# Altium footprint library 22-Transformer.PcbLib: 68 footprints (part 3 of 5) (continued)
## XFMR_EDA-01905-V1-0_MISC4 [mm] "E55/28/21 Core + Coil Former + Spring + Clasp"
height 65.3
pads (4):
  round 5.6 hole 2.7: MTG(-25.4,-13.97) MTG(-25.4,13.97) MTG(25.4,-13.97) MTG(25.4,13.97)
Top Overlay:
  lines w0.2: -29.4,-4.509 -30.1,-4.254 -30.1,4.254 -29.4,4.509 ; -27.842,-11.75 -29.4,-11.75 ; -27.842,11.75 -29.4,11.75 ; -26.122,-10.75 -28.4,-10.75 -28.4,10.75 -26.122,10.75 ; -22.647,-12.15 22.647,-12.15 ; -22.647,12.15 22.647,12.15 ; -21.354,-12.15 ccw(c-18.4,-13.97) -21.87,-13.97 cw(c-25.4,-13.97) -28.93,-13.97 -28.93,-11.75 -29.4,-11.75 ; -21.354,12.15 cw(c-18.4,13.97) -21.87,13.97 ccw(c-25.4,13.97) -28.93,13.97 -28.93,11.75 -29.4,11.75 ; -18.3,-12.15 -18.3,-18.075 ccw(c-15.3,-18.075) -15.3,-21.075 15.3,-21.075 ccw(c15.3,-18.075) 18.3,-18.075 18.3,-12.15 ; -18.3,12.15 -18.3,18.075 cw(c-15.3,18.075) -15.3,21.075 15.3,21.075 cw(c15.3,18.075) 18.3,18.075 18.3,12.15 ; 21.354,-12.15 cw(c18.4,-13.97) 21.87,-13.97 ccw(c25.4,-13.97) 28.93,-13.97 28.93,-11.75 29.4,-11.75 ; 21.354,12.15 ccw(c18.4,13.97) 21.87,13.97 cw(c25.4,13.97) 28.93,13.97 28.93,11.75 29.4,11.75 ; 26.122,-10.75 28.4,-10.75 28.4,10.75 26.122,10.75 ; 27.842,-11.75 29.4,-11.75 ; 27.842,11.75 29.4,11.75 ; 29.4,-4.509 30.1,-4.254 30.1,4.254 29.4,4.509 ; -29.4,-11.75 -29.4,11.75 ; -29.4,-11.75 -29.4,11.75 ; 29.4,-11.75 29.4,11.75 ; 29.4,-11.75 29.4,11.75 ; -20.874,-2.837 cw(c-19.898,0) -20.874,2.837 -5,8.3 -5,-8.3 -20.874,-2.837 ; 5,-8.3 5,8.3 20.875,2.837 cw(c19.898,0) 20.875,-2.837 5,-8.3
Mechanical 8:
  lines w0.1: -25.9,13.97 -25.4,13.97 ; -25.4,13.47 -25.4,13.97 ; -25.4,14.47 -25.4,13.97 ; -24.9,13.97 -25.4,13.97 ; 24.9,13.97 25.4,13.97 ; 25.4,13.47 25.4,13.97 ; 25.4,14.47 25.4,13.97 ; 25.9,13.97 25.4,13.97 ; -25.4,-13.97 -25.9,-13.97 -25.4,-13.97 ; -25.4,-13.97 -25.4,-13.47 -25.4,-13.97 ; -25.4,-13.97 -24.9,-13.97 -25.4,-13.97 ; -25.4,-13.97 -25.4,-14.47 -25.4,-13.97 ; 0,0 -0.5,0 0,0 ; 0,0 0,0.5 0,0 ; 0,0 0.5,0 0,0 ; 0,0 0,-0.5 0,0 ; 25.4,-13.97 24.9,-13.97 25.4,-13.97 ; 25.4,-13.97 25.4,-13.47 25.4,-13.97 ; 25.4,-13.97 25.9,-13.97 25.4,-13.97 ; 25.4,-13.97 25.4,-14.47 25.4,-13.97
Mechanical 14:
  circle w0.1: c-25.4,13.97 r1.4
  circle w0.1: c25.4,13.97 r1.4
  circle w0.1: c-25.4,-13.97 r1.4
  circle w0.1: c25.4,-13.97 r1.4
  lines w0.1: -29.4,-4.509 -30.1,-4.254 -30.1,4.254 -29.4,4.509 ; -25.4,-11.15 -23,-11.15 -23,-12.15 23,-12.15 23,-11.15 25.403,-11.15 ; -25.4,11.15 -23,11.15 -23,12.15 23,12.15 23,11.15 25.4,11.15 ; -21.354,-12.15 ccw(c-18.4,-13.97) -21.87,-13.97 cw(c-25.4,-13.97) -28.93,-13.97 -28.93,-11.75 -29.4,-11.75 ; -21.354,12.15 cw(c-18.4,13.97) -21.87,13.97 ccw(c-25.4,13.97) -28.93,13.97 -28.93,11.75 -29.4,11.75 ; -18.3,-12.15 -18.3,-18.075 ccw(c-15.3,-18.075) -15.3,-21.075 15.3,-21.075 ccw(c15.3,-18.075) 18.3,-18.075 18.3,-12.15 ; -18.3,12.15 -18.3,18.075 cw(c-15.3,18.075) -15.3,21.075 15.3,21.075 cw(c15.3,18.075) 18.3,18.075 18.3,12.15 ; 21.354,-12.15 cw(c18.4,-13.97) 21.87,-13.97 ccw(c25.4,-13.97) 28.93,-13.97 28.93,-11.75 29.4,-11.75 ; 21.354,12.15 ccw(c18.4,13.97) 21.87,13.97 cw(c25.4,13.97) 28.93,13.97 28.93,11.75 29.4,11.75 ; 29.4,-4.509 30.1,-4.254 30.1,4.254 29.4,4.509 ; -29.4,-11.75 -29.4,11.75 ; -29.4,-11.75 -25.4,-11.75 -25.4,-10.75 -28.4,-10.75 -28.4,10.75 -25.4,10.75 -25.4,11.75 -29.4,11.75 ; -29.4,-11.75 -29.4,11.75 ; 29.4,-11.75 25.403,-11.75 25.403,-10.75 28.4,-10.75 28.4,10.75 25.4,10.75 25.4,11.75 29.4,11.75 ; 29.4,-11.75 29.4,11.75 ; 29.4,-11.75 29.4,11.75 ; -20.874,-2.837 cw(c-19.898,0) -20.874,2.837 -5,8.3 -5,-8.3 -20.874,-2.837 ; 5,-8.3 5,8.3 20.875,2.837 cw(c19.898,0) 20.875,-2.837 5,-8.3
3D body "XFMR_EDA-01905-V1-0_misc4.stp": height 65.3, standoff -4, extent -30.1,-21.275 30.1,21.275

## XFMR_EDA-01905-V1-0_MISC5 [mm] "ETD39 Core + Coil Former + Yoke"
height 33.5
pads (16):
  round 2.1 hole 1.4: 1(-17.78,-15.24) 2(-12.7,-15.24) 3(-7.62,-15.24) 4(-2.54,-15.24) 5(2.54,-15.24) 6(7.62,-15.24) 7(12.7,-15.24) 8(17.78,-15.24) 9(17.78,15.24) 10(12.7,15.24) 11(7.62,15.24) 12(2.54,15.24) 13(-2.54,15.24) 14(-7.62,15.24) 15(-12.7,15.24) 16(-17.78,15.24)
Top Overlay:
  lines w0.2: -20,-13.59 -20,13.59 ; -13.178,-13.59 -13.178,13.59 ; -13.178,-12.85 13.178,-12.85 ; -13.178,12.85 13.178,12.85 ; -8.63,-14.2 -11.27,-14.2 -11.27,-13.59 -21.7,-13.59 -21.7,-12.94 -22.5,-12.94 -22.5,-20.846 ccw(c-21.2,-20.846) -22.3,-21.539 -22.3,-23.4 22.3,-23.4 22.3,-21.676 ccw(c21.3,-20.846) 22.599,-20.806 ; -8.63,14.2 -11.27,14.2 -11.27,13.59 -21.7,13.59 -21.7,12.94 -22.5,12.94 -22.5,20.846 cw(c-21.2,20.846) -22.3,21.539 -22.3,23.4 22.3,23.4 22.3,21.676 cw(c21.3,20.846) 22.599,20.806 ; -6.61,-14.2 -3.55,-14.2 ; -6.61,14.2 -3.55,14.2 ; -6.15,-14.2 -6.15,-23.64 -5.15,-23.64 -5.15,-14.2 ; -6.15,14.2 -6.15,17.7 -5.15,17.7 -5.15,14.2 ; -3.95,-14.2 -3.95,-12.85 ; -3.95,12.85 -3.95,14.2 ; -1.53,-14.2 1.53,-14.2 ; -1.53,14.2 1.53,14.2 ; 3.55,-14.2 6.61,-14.2 ; 3.55,14.2 6.61,14.2 ; 3.95,-14.2 3.95,-12.85 ; 3.95,12.85 3.95,14.2 ; 5.15,-14.2 5.15,-17.09 6.15,-17.09 6.15,-14.2 ; 5.15,14.2 5.15,17.7 6.15,17.7 6.15,14.2 ; 8.63,-14.2 11.27,-14.2 11.27,-13.59 21.8,-13.59 21.8,-12.94 22.6,-12.94 22.6,-20.846 ; 8.63,14.2 11.27,14.2 11.27,13.59 21.8,13.59 21.8,12.94 22.6,12.94 22.6,20.846 ; 13.178,-13.59 13.178,13.59 ; 20,-13.59 20,13.59 ; -12.425,-12.85 -12.425,12.85 12.425,12.85 12.425,-12.85 -12.425,-12.85
  text "1" at -17.899,-19.74 h1.2
  text "2" at -13.033,-19.74 h1.2
  text "3" at -7.953,-19.74 h1.2
  text "4" at -2.897,-19.74 h1.2
  text "5" at 2.207,-19.74 h1.2
  text "6" at 7.31,-19.74 h1.2
  text "7" at 12.367,-19.74 h1.2
  text "8" at 17.447,-19.74 h1.2
  text "9" at 17.447,18.74 h1.2
  text "14" at -8.358,18.74 h1.2
  text "13" at -3.254,18.74 h1.2
  text "12" at 1.826,18.74 h1.2
  text "10" at 11.986,18.74 h1.2
  text "11" at 6.906,18.74 h1.2
  text "15" at -13.414,18.74 h1.2
  text "16" at -18.494,18.74 h1.2
Mechanical 8:
  lines w0.1: -18.78,-15.24 -17.78,-15.24 ; -18.78,15.24 -17.78,15.24 ; -17.78,-16.24 -17.78,-15.24 ; -17.78,-14.24 -17.78,-15.24 ; -17.78,14.24 -17.78,15.24 ; -17.78,16.24 -17.78,15.24 ; -16.78,-15.24 -17.78,-15.24 ; -16.78,15.24 -17.78,15.24 ; -13.7,-15.24 -12.7,-15.24 ; -13.7,15.24 -12.7,15.24 ; -12.7,-16.24 -12.7,-15.24 ; -12.7,-14.24 -12.7,-15.24 ; -12.7,14.24 -12.7,15.24 ; -12.7,16.24 -12.7,15.24 ; -11.7,-15.24 -12.7,-15.24 ; -11.7,15.24 -12.7,15.24 ; -8.62,-15.24 -7.62,-15.24 ; -8.62,15.24 -7.62,15.24 ; -7.62,-16.24 -7.62,-15.24 ; -7.62,-14.24 -7.62,-15.24 ; -7.62,14.24 -7.62,15.24 ; -7.62,16.24 -7.62,15.24 ; -6.62,-15.24 -7.62,-15.24 ; -6.62,15.24 -7.62,15.24 ; -3.54,-15.24 -2.54,-15.24 ; -3.54,15.24 -2.54,15.24 ; -2.54,-16.24 -2.54,-15.24 ; -2.54,-14.24 -2.54,-15.24 ; -2.54,14.24 -2.54,15.24 ; -2.54,16.24 -2.54,15.24 ; -1.54,-15.24 -2.54,-15.24 ; -1.54,15.24 -2.54,15.24 ; -1,0 0,0 ; 0,-1 0,0 ; 0,1 0,0 ; 1,0 0,0 ; 1.54,-15.24 2.54,-15.24 ; 1.54,15.24 2.54,15.24 ; 2.54,-16.24 2.54,-15.24 ; 2.54,-14.24 2.54,-15.24 ; 2.54,14.24 2.54,15.24 ; 2.54,16.24 2.54,15.24 ; 3.54,-15.24 2.54,-15.24 ; 3.54,15.24 2.54,15.24 ; 6.62,-15.24 7.62,-15.24 ; 6.62,15.24 7.62,15.24 ; 7.62,-16.24 7.62,-15.24 ; 7.62,-14.24 7.62,-15.24 ; 7.62,14.24 7.62,15.24 ; 7.62,16.24 7.62,15.24 ; 8.62,-15.24 7.62,-15.24 ; 8.62,15.24 7.62,15.24 ; 11.7,-15.24 12.7,-15.24 ; 11.7,15.24 12.7,15.24 ; 12.7,-16.24 12.7,-15.24 ; 12.7,-14.24 12.7,-15.24 ; 12.7,14.24 12.7,15.24 ; 12.7,16.24 12.7,15.24 ; 13.7,-15.24 12.7,-15.24 ; 13.7,15.24 12.7,15.24 ; 16.78,-15.24 17.78,-15.24 ; 16.78,15.24 17.78,15.24 ; 17.78,-16.24 17.78,-15.24 ; 17.78,-14.24 17.78,-15.24 ; 17.78,14.24 17.78,15.24 ; 17.78,16.24 17.78,15.24 ; 18.78,-15.24 17.78,-15.24 ; 18.78,15.24 17.78,15.24
Mechanical 14:
  lines w0.1: -20,-13.59 -20,13.59 ; -13.178,-13.59 -13.178,13.59 ; -13.178,-12.85 13.178,-12.85 ; -13.178,12.85 13.178,12.85 ; -6.15,-14.2 -6.15,-23.64 -5.15,-23.64 -5.15,-14.2 ; -6.15,14.2 -6.15,17.7 -5.15,17.7 -5.15,14.2 ; -3.95,-14.2 -3.95,-12.85 ; -3.95,12.85 -3.95,14.2 ; 3.95,-14.2 3.95,-12.85 ; 3.95,12.85 3.95,14.2 ; 5.15,-14.2 5.15,-17.09 6.15,-17.09 6.15,-14.2 ; 5.15,14.2 5.15,17.7 6.15,17.7 6.15,14.2 ; 13.178,-13.59 13.178,13.59 ; 20,-13.59 20,13.59 ; 22.6,-20.846 22.6,-12.94 21.8,-12.94 21.8,-13.59 11.27,-13.59 11.27,-14.2 -11.27,-14.2 -11.27,-13.59 -21.7,-13.59 -21.7,-12.94 -22.5,-12.94 -22.5,-20.846 ccw(c-21.2,-20.846) -22.3,-21.539 -22.3,-23.4 22.3,-23.4 22.3,-21.676 ccw(c21.3,-20.846) 22.599,-20.806 ; 22.599,20.806 ccw(c21.3,20.846) 22.3,21.676 22.3,23.4 -22.3,23.4 -22.3,21.539 ccw(c-21.2,20.846) -22.5,20.846 -22.5,12.94 -21.7,12.94 -21.7,13.59 -11.27,13.59 -11.27,14.2 11.27,14.2 11.27,13.59 21.8,13.59 21.8,12.94 22.6,12.94 22.6,20.846 ; -12.425,-12.85 -12.425,12.85 12.425,12.85 12.425,-12.85 -12.425,-12.85
  text "1" at -17.899,-19.74 h1.2
  text "2" at -13.033,-19.74 h1.2
  text "3" at -7.953,-19.74 h1.2
  text "4" at -2.897,-19.74 h1.2
  text "5" at 2.207,-19.74 h1.2
  text "6" at 7.31,-19.74 h1.2
  text "7" at 12.367,-19.74 h1.2
  text "8" at 17.447,-19.74 h1.2
  text "9" at 17.447,18.74 h1.2
  text "14" at -8.358,18.74 h1.2
  text "13" at -3.254,18.74 h1.2
  text "12" at 1.826,18.74 h1.2
  text "10" at 11.986,18.74 h1.2
  text "11" at 6.906,18.74 h1.2
  text "15" at -13.414,18.74 h1.2
  text "16" at -18.494,18.74 h1.2
3D body "XFMR_EDA-01905-V1-0_misc5.stp": height 35.5, standoff -4.5, extent -22.5,-23.64 22.6,23.4

## XFMR_EDA-02116-V1-0_MISC1 [mm] "Transformer D40 x L 65.5"
height 40
Top Overlay:
  lines w0.2: -32.3,-11.45 -57.3,-11.45 -57.3,-7.75 -32.3,-7.75 ; -32.3,3.75 -42,3.75 -42,4.65 -32.3,4.65 ; -32.3,10.35 -42,10.35 -42,11.25 -32.3,11.25 ; -32.3,-20.25 -32.3,20.25 33.3,20.25 33.3,-20.25 -32.3,-20.25
  text "CATHODE" at -42,5.4 h1.5
  text "GATE" at -39.75,12 h1.5
Top Solder:
  lines w1.27: -23.5,-13.51 ccw(c-23,-13.51) -23,-14.01 -16,-14.01 ccw(c-16,-13.51) -15.5,-13.51 -15.5,-11.51 ccw(c-16,-11.51) -16,-11.01 -23,-11.01 ccw(c-23,-11.51) -23.5,-11.51 -23.5,-13.51 ; -23.5,11.49 ccw(c-23,11.49) -23,10.99 -16,10.99 ccw(c-16,11.49) -15.5,11.49 -15.5,13.49 ccw(c-16,13.49) -16,13.99 -23,13.99 ccw(c-23,13.49) -23.5,13.49 -23.5,11.49 ; 16.5,-13.51 ccw(c17,-13.51) 17,-14.01 24,-14.01 ccw(c24,-13.51) 24.5,-13.51 24.5,-11.51 ccw(c24,-11.51) 24,-11.01 17,-11.01 ccw(c17,-11.51) 16.5,-11.51 16.5,-13.51 ; 16.5,11.49 ccw(c17,11.49) 17,10.99 24,10.99 ccw(c24,11.49) 24.5,11.49 24.5,13.49 ccw(c24,13.49) 24,13.99 17,13.99 ccw(c17,13.49) 16.5,13.49 16.5,11.49
Bottom Solder:
  lines w1.27: -23.5,-13.51 ccw(c-23,-13.51) -23,-14.01 -16,-14.01 ccw(c-16,-13.51) -15.5,-13.51 -15.5,-11.51 ccw(c-16,-11.51) -16,-11.01 -23,-11.01 ccw(c-23,-11.51) -23.5,-11.51 -23.5,-13.51 ; -23.5,11.49 ccw(c-23,11.49) -23,10.99 -16,10.99 ccw(c-16,11.49) -15.5,11.49 -15.5,13.49 ccw(c-16,13.49) -16,13.99 -23,13.99 ccw(c-23,13.49) -23.5,13.49 -23.5,11.49 ; 16.5,-13.51 ccw(c17,-13.51) 17,-14.01 24,-14.01 ccw(c24,-13.51) 24.5,-13.51 24.5,-11.51 ccw(c24,-11.51) 24,-11.01 17,-11.01 ccw(c17,-11.51) 16.5,-11.51 16.5,-13.51 ; 16.5,11.49 ccw(c17,11.49) 17,10.99 24,10.99 ccw(c24,11.49) 24.5,11.49 24.5,13.49 ccw(c24,13.49) 24,13.99 17,13.99 ccw(c17,13.49) 16.5,13.49 16.5,11.49
Keep-Out Layer:
  board cut-out: -23.424,-11.217 -23.283,-11.076 -23.099,-11 -23,-11 -16,-11 -15.901,-11 -15.717,-11.076 -15.576,-11.217 -15.5,-11.401 -15.5,-11.5 -15.5,-13.5 -15.5,-13.599 -15.576,-13.783 -15.717,-13.924 -15.901,-14 -16,-14 -23,-14 -23.099,-14 -23.283,-13.924 -23.424,-13.783 -23.5,-13.599 -23.5,-11.401
  board cut-out: 16.576,-11.217 16.717,-11.076 16.901,-11 17,-11 24,-11 24.099,-11 24.283,-11.076 24.424,-11.217 24.5,-11.401 24.5,-11.5 24.5,-13.5 24.5,-13.599 24.424,-13.783 24.283,-13.924 24.099,-14 24,-14 17,-14 16.901,-14 16.717,-13.924 16.576,-13.783 16.5,-13.599 16.5,-11.401
  board cut-out: 16.576,13.783 16.717,13.924 16.901,14 17,14 24,14 24.099,14 24.283,13.924 24.424,13.783 24.5,13.599 24.5,13.5 24.5,11.5 24.5,11.401 24.424,11.217 24.283,11.076 24.099,11 24,11 17,11 16.901,11 16.717,11.076 16.576,11.217 16.5,11.401 16.5,13.599
  board cut-out: -23.424,13.783 -23.283,13.924 -23.099,14 -23,14 -16,14 -15.901,14 -15.717,13.924 -15.576,13.783 -15.5,13.599 -15.5,13.5 -15.5,11.5 -15.5,11.401 -15.576,11.217 -15.717,11.076 -15.901,11 -16,11 -23,11 -23.099,11 -23.283,11.076 -23.424,11.217 -23.5,11.401 -23.5,13.599
Mechanical 1:
  lines w1.27: -23.5,-13.5 ccw(c-23,-13.5) -23,-14 -16,-14 ccw(c-16,-13.5) -15.5,-13.5 -15.5,-11.5 ccw(c-16,-11.5) -16,-11 -23,-11 ccw(c-23,-11.5) -23.5,-11.5 -23.5,-13.5 ; -23.5,11.5 ccw(c-23,11.5) -23,11 -16,11 ccw(c-16,11.5) -15.5,11.5 -15.5,13.5 ccw(c-16,13.5) -16,14 -23,14 ccw(c-23,13.5) -23.5,13.5 -23.5,11.5 ; 16.5,-13.5 ccw(c17,-13.5) 17,-14 24,-14 ccw(c24,-13.5) 24.5,-13.5 24.5,-11.5 ccw(c24,-11.5) 24,-11 17,-11 ccw(c17,-11.5) 16.5,-11.5 16.5,-13.5 ; 16.5,11.5 ccw(c17,11.5) 17,11 24,11 ccw(c24,11.5) 24.5,11.5 24.5,13.5 ccw(c24,13.5) 24,14 17,14 ccw(c17,13.5) 16.5,13.5 16.5,11.5
Mechanical 8:
  lines w0.1: -20,-12.5 -19.5,-12.5 ; -20,12.5 -19.5,12.5 ; -19.5,-13 -19.5,-12.5 ; -19.5,-12 -19.5,-12.5 ; -19.5,12 -19.5,12.5 ; -19.5,13 -19.5,12.5 ; -19,-12.5 -19.5,-12.5 ; -19,12.5 -19.5,12.5 ; -0.5,0 0,0 ; 0,-0.5 0,0 ; 0,0.5 0,0 ; 0.5,0 0,0 ; 20,-12.5 20.5,-12.5 ; 20,12.5 20.5,12.5 ; 20.5,-13 20.5,-12.5 ; 20.5,-12 20.5,-12.5 ; 20.5,12 20.5,12.5 ; 20.5,13 20.5,12.5 ; 21,-12.5 20.5,-12.5 ; 21,12.5 20.5,12.5
Mechanical 14:
  lines w0.1: -32.3,-11.45 -57.3,-11.45 -57.3,-7.75 -32.3,-7.75 ; -32.3,3.75 -42,3.75 -42,4.65 -32.3,4.65 ; -32.3,10.35 -42,10.35 -42,11.25 -32.3,11.25 ; -32.3,-20.25 -32.3,20.25 33.3,20.25 33.3,-20.25 -32.3,-20.25 ; -23.5,-13.5 ccw(c-23,-13.5) -23,-14 -16,-14 ccw(c-16,-13.5) -15.5,-13.5 -15.5,-11.5 ccw(c-16,-11.5) -16,-11 -23,-11 ccw(c-23,-11.5) -23.5,-11.5 -23.5,-13.5 ; -23.5,11.5 ccw(c-23,11.5) -23,11 -16,11 ccw(c-16,11.5) -15.5,11.5 -15.5,13.5 ccw(c-16,13.5) -16,14 -23,14 ccw(c-23,13.5) -23.5,13.5 -23.5,11.5 ; 16.5,-13.5 ccw(c17,-13.5) 17,-14 24,-14 ccw(c24,-13.5) 24.5,-13.5 24.5,-11.5 ccw(c24,-11.5) 24,-11 17,-11 ccw(c17,-11.5) 16.5,-11.5 16.5,-13.5 ; 16.5,11.5 ccw(c17,11.5) 17,11 24,11 ccw(c24,11.5) 24.5,11.5 24.5,13.5 ccw(c24,13.5) 24,14 17,14 ccw(c17,13.5) 16.5,13.5 16.5,11.5
  text "CATHODE" at -42,5.4 h1.5
  text "GATE" at -39.75,12 h1.5
Drill Drawing:
  lines w0.1: -28.5,-12.5 -20.5,-12.5 ; -28.5,12.5 -20.5,12.5 ; -27.842,-11.56 -27.5,-12.5 ; -27.842,11.56 -27.5,12.5 ; -27.158,-11.56 -27.5,-12.5 ; -27.158,11.56 -27.5,12.5 ; -20,-12.5 -19.5,-12.5 ; -20,12.5 -19.5,12.5 ; -19.5,-18.5 -19.5,-13.5 ; -19.5,-13 -19.5,-12.5 ; -19.5,-12 -19.5,-12.5 ; -19.5,-11.5 -19.5,11.5 ; -19.5,12 -19.5,12.5 ; -19.5,13 -19.5,12.5 ; -19,-12.5 -19.5,-12.5 ; -19,12.5 -19.5,12.5 ; -18.56,-17.842 -19.5,-17.5 ; -18.56,-17.158 -19.5,-17.5 ; -18.5,-12.5 19.5,-12.5 ; -18.5,12.5 19.5,12.5 ; -0.5,0 0,0 ; 0,-0.5 0,0 ; 0,0.5 0,0 ; 0.5,0 0,0 ; 14.5,11 16.5,11 ; 14.5,14 16.5,14 16.5,16 ; 14.658,10.06 15,11 15.342,10.06 ; 14.658,14.94 15,14 15.342,14.94 ; 15,10.06 15,14.94 ; 15.56,15.158 16.5,15.5 15.56,15.842 ; 15.56,15.5 25.44,15.5 ; 19.56,-17.842 20.5,-17.5 ; 19.56,-17.158 20.5,-17.5 ; 20,-12.5 20.5,-12.5 ; 20,12.5 20.5,12.5 ; 20.5,-18.5 20.5,-13.5 ; 20.5,-13 20.5,-12.5 ; 20.5,-12 20.5,-12.5 ; 20.5,-11.5 20.5,11.5 ; 20.5,12 20.5,12.5 ; 20.5,13 20.5,12.5 ; 21,-12.5 20.5,-12.5 ; 21,12.5 20.5,12.5 ; 23.447,11.569 24.354,11.146 ; 23.931,12.053 24.354,11.146 ; 24.5,14 24.5,16 ; 25.44,15.158 24.5,15.5 25.44,15.842 ; 27.636,12.598 22.902,12.598 24.354,11.146 ; -27.5,-12.5 -27.5,12.5 ; -19.5,-17.5 20.5,-17.5 ; -23.5,-13.5 ccw(c-23,-13.5) -23,-14 -16,-14 ccw(c-16,-13.5) -15.5,-13.5 -15.5,-11.5 ccw(c-16,-11.5) -16,-11 -23,-11 ccw(c-23,-11.5) -23.5,-11.5 -23.5,-13.5 ; -23.5,11.5 ccw(c-23,11.5) -23,11 -16,11 ccw(c-16,11.5) -15.5,11.5 -15.5,13.5 ccw(c-16,13.5) -16,14 -23,14 ccw(c-23,13.5) -23.5,13.5 -23.5,11.5 ; 16.5,-13.5 ccw(c17,-13.5) 17,-14 24,-14 ccw(c24,-13.5) 24.5,-13.5 24.5,-11.5 ccw(c24,-11.5) 24,-11 17,-11 ccw(c17,-11.5) 16.5,-11.5 16.5,-13.5 ; 16.5,11.5 ccw(c17,11.5) 17,11 24,11 ccw(c24,11.5) 24.5,11.5 24.5,13.5 ccw(c24,13.5) 24,14 17,14 ccw(c17,13.5) 16.5,13.5 16.5,11.5
  text "3" at 14.741,11.395 h1
  text "8" at 20.15,15.759 h1
  text "r0.5" at 25.074,12.807 h1
  text "25" at -27.759,-0.708 h1
  text "40" at -0.25,-17.241 h1
3D body "XFMR_EDA-02116_misc1.stp": height 41.15, standoff -8, extent -64.15,-20.288 33.3,28.71

## XFMR_MA-COM_SM-22 (H260) [mm] "MA-COM E-Serie RF 1:1 Transmission Line Ttransformer 4.5-3000MHz"
height 2.6
pads (5):
  rect 0.76x1.4 smd: 1(-1.27,1.715) 2(0,1.715) 3(1.27,1.715) 4(1.27,-1.715) 5(-1.27,-1.715)
Top Overlay:
  circle w0.25: c-2.175,1.6 r0.125
  lines w0.2: -1.905,-0.615 -1.905,0.615 ; -0.49,-1.295 0.49,-1.295 ; 1.905,-0.615 1.905,0.615
Mechanical 8:
  lines w0.1: -1.77,-1.715 -1.27,-1.715 ; -1.77,1.715 -1.27,1.715 ; -1.27,-2.215 -1.27,-1.715 ; -1.27,-1.215 -1.27,-1.715 ; -1.27,1.215 -1.27,1.715 ; -1.27,2.215 -1.27,1.715 ; -0.77,-1.715 -1.27,-1.715 ; -0.77,1.715 -1.27,1.715 ; -0.5,0 0,0 ; -0.5,1.715 0,1.715 ; 0,-0.5 0,0 ; 0,0.5 0,0 ; 0,1.215 0,1.715 ; 0,2.215 0,1.715 ; 0.5,0 0,0 ; 0.5,1.715 0,1.715 ; 0.77,-1.715 1.27,-1.715 ; 0.77,1.715 1.27,1.715 ; 1.27,-2.215 1.27,-1.715 ; 1.27,-1.215 1.27,-1.715 ; 1.27,1.215 1.27,1.715 ; 1.27,2.215 1.27,1.715 ; 1.77,-1.715 1.27,-1.715 ; 1.77,1.715 1.27,1.715 ; -1.65,-2.415 -1.65,-1.015 -0.89,-1.015 -0.89,-2.415 -1.65,-2.415 ; -1.65,1.015 -0.89,1.015 -0.89,2.415 -1.65,2.415 -1.65,1.015 ; -0.38,1.015 0.38,1.015 0.38,2.415 -0.38,2.415 -0.38,1.015 ; 0.89,-2.415 0.89,-1.015 1.65,-1.015 1.65,-2.415 0.89,-2.415 ; 0.89,1.015 1.65,1.015 1.65,2.415 0.89,2.415 0.89,1.015
Mechanical 14:
  circle w0.25: c-2.175,1.6 r0.125
  lines w0.1: -1.905,-1.095 1.905,-1.095 ; -1.905,1.095 1.905,1.095 ; -1.625,-1.01 -0.915,-1.01 -0.915,-2.03 ; -0.915,1.01 -0.915,2.03 ; -0.355,1.01 -0.355,2.03 ; 1.65,-1.391 cw(c1.75,-1.395) 1.746,-1.295 ; 1.75,-1.295 1.905,-1.295 1.905,1.295 1.75,1.295 cw(c1.75,1.395) 1.65,1.395 ; -1.65,-1.395 ccw(c-1.75,-1.395) -1.75,-1.295 -1.905,-1.295 -1.905,1.295 -1.75,1.295 ccw(c-1.75,1.395) -1.65,1.395 ; -1.65,-1.395 -0.89,-1.395 ; -1.65,-1.395 -1.65,-1.905 -0.89,-1.905 -0.89,-1.395 ; -1.65,1.395 -1.65,1.905 -0.89,1.905 -0.89,1.395 ; -1.65,1.395 -0.89,1.395 ; -0.89,-1.395 cw(c-0.79,-1.395) -0.79,-1.295 0.79,-1.295 cw(c0.79,-1.395) 0.89,-1.395 ; -0.89,1.395 ccw(c-0.79,1.395) -0.79,1.295 -0.48,1.295 ccw(c-0.48,1.395) -0.38,1.395 ; -0.38,1.395 -0.38,1.905 0.38,1.905 0.38,1.395 ; -0.38,1.395 0.38,1.395 ; 0.38,1.395 ccw(c0.48,1.395) 0.48,1.295 0.79,1.295 ccw(c0.79,1.395) 0.89,1.395 ; 0.89,-1.395 1.65,-1.395 1.65,-1.905 0.89,-1.905 0.89,-1.395 ; 0.89,1.395 0.89,1.905 1.65,1.905 1.65,1.395 ; 0.89,1.395 1.65,1.395
Mechanical 15:
  lines w0.05: -2.155,-2.665 -2.155,2.665 2.155,2.665 2.155,-2.665 -2.155,-2.665
3D body "XFMR_MA-COM_SM-22 (H260).stp": height 2.6, standoff 0, extent -1.905,-1.905 1.905,1.905

## XFMR_MINI-CIRCUITS_AT224 [mm] "MINI-CIRCUITS RF Transformer, Case AT224 - Body 3.81X3.81mm"
height 3.81
pads (5):
  rect 0.76x1.65 smd: 1(-1.27,1.59) 2(0,1.59) 3(1.27,1.59) 4(1.27,-1.59) 6(-1.27,-1.59)
Top Overlay:
  circle w0.25: c-2.175,1.6 r0.125
  lines w0.2: -1.905,-0.365 -1.905,0.365 1.905,0.365 1.905,-0.365 -1.905,-0.365
Mechanical 8:
  lines w0.1: -1.27,-2.59 -1.27,-1.59 ; -1.27,-0.59 -1.27,-1.59 ; -1.27,0.59 -1.27,1.59 ; -1.27,2.59 -1.27,1.59 ; -1,0 0,0 ; -0.38,-0.765 0.38,-0.765 ; 0,-1 0,0 ; 0,0.59 0,1.59 0,2.59 ; 0,1 0,0 ; 1,0 0,0 ; 1.27,-2.59 1.27,-1.59 1.27,-0.59 ; 1.27,0.59 1.27,1.59 1.27,2.59 ; 1.65,-1.59 -1.27,-1.59 ; 1.65,1.59 -1.27,1.59 ; -1.65,-2.415 -1.65,-0.765 -0.89,-0.765 -0.89,-2.415 -1.65,-2.415 ; -1.65,0.765 -1.65,2.415 -0.89,2.415 -0.89,0.765 -1.65,0.765 ; -0.38,0.765 -0.38,2.415 0.38,2.415 0.38,0.765 -0.38,0.765 ; 0.89,-2.415 0.89,-0.765 1.65,-0.765 1.65,-2.415 0.89,-2.415 ; 0.89,0.765 0.89,2.415 1.65,2.415 1.65,0.765 0.89,0.765
Mechanical 14:
  circle w0.25: c-2.175,1.6 r0.125
  lines w0.1: -1.625,-1.905 -1.625,-1.145 -0.915,-1.145 -0.915,-1.905 ; -1.625,1.905 -1.625,1.145 -0.915,1.145 -0.915,1.905 ; -0.355,1.905 -0.355,1.145 0.355,1.145 0.355,1.905 ; 0.915,-1.905 0.915,-1.145 1.625,-1.145 1.625,-1.905 ; 0.915,1.905 0.915,1.145 1.625,1.145 1.625,1.905 ; -1.905,-1.905 -1.905,1.905 1.905,1.905 1.905,-1.905 -1.905,-1.905
Mechanical 15:
  lines w0.05: -2.155,-2.665 -2.155,2.665 2.155,2.665 2.155,-2.665 -2.155,-2.665
3D body "XFMR_MINI-CIRCUITS_AT224.stp": height 3.81, standoff 0, extent -1.905,-1.905 1.905,1.905

## XFMR_MINI-CIRCUITS_AT224-1 [mm] "MINI-CIRCUITS RF Transformer, Case AT224-1 - Body 3.81X3.81mm"
height 4.06
pads (5):
  rect 0.76x1.65 smd: 1(-1.27,1.59) 2(0,1.59) 3(1.27,1.59) 4(1.27,-1.59) 6(-1.27,-1.59)
Top Overlay:
  circle w0.25: c-2.175,1.6 r0.125
  lines w0.2: -1.905,-0.365 -1.905,0.365 1.905,0.365 1.905,-0.365 -1.905,-0.365
Mechanical 8:
  lines w0.1: -1.27,-2.59 -1.27,-1.59 ; -1.27,-0.59 -1.27,-1.59 ; -1.27,0.59 -1.27,1.59 ; -1.27,2.59 -1.27,1.59 ; -1,0 0,0 ; -0.38,-0.765 0.38,-0.765 ; 0,-1 0,0 ; 0,0.59 0,1.59 0,2.59 ; 0,1 0,0 ; 1,0 0,0 ; 1.27,-2.59 1.27,-1.59 1.27,-0.59 ; 1.27,0.59 1.27,1.59 1.27,2.59 ; 1.65,-1.59 -1.27,-1.59 ; 1.65,1.59 -1.27,1.59 ; -1.65,-2.415 -1.65,-0.765 -0.89,-0.765 -0.89,-2.415 -1.65,-2.415 ; -1.65,0.765 -1.65,2.415 -0.89,2.415 -0.89,0.765 -1.65,0.765 ; -0.38,0.765 -0.38,2.415 0.38,2.415 0.38,0.765 -0.38,0.765 ; 0.89,-2.415 0.89,-0.765 1.65,-0.765 1.65,-2.415 0.89,-2.415 ; 0.89,0.765 0.89,2.415 1.65,2.415 1.65,0.765 0.89,0.765
Mechanical 14:
  circle w0.25: c-2.175,1.6 r0.125
  lines w0.1: -1.625,-1.905 -1.625,-1.145 -0.915,-1.145 -0.915,-1.905 ; -1.625,1.905 -1.625,1.145 -0.915,1.145 -0.915,1.905 ; -0.355,1.905 -0.355,1.145 0.355,1.145 0.355,1.905 ; 0.915,-1.905 0.915,-1.145 1.625,-1.145 1.625,-1.905 ; 0.915,1.905 0.915,1.145 1.625,1.145 1.625,1.905 ; -1.905,-1.905 -1.905,1.905 1.905,1.905 1.905,-1.905 -1.905,-1.905
Mechanical 15:
  lines w0.05: -2.155,-2.665 -2.155,2.665 2.155,2.665 2.155,-2.665 -2.155,-2.665
3D body "XFMR_MINI-CIRCUITS_AT224-1.stp": height 4.06, standoff 0, extent -1.905,-1.905 1.905,1.905

## XFMR_MINI-CIRCUITS_AT224-3 [mm] "MINI-CIRCUITS RF Transformer, Case AT224-3 - Body 3.81X3.81mm"
height 3.81
pads (5):
  rect 0.76x1.65 smd: 1(-1.27,1.59) 2(0,1.59) 3(1.27,1.59) 4(1.27,-1.59) 6(-1.27,-1.59)
Top Overlay:
  circle w0.25: c-2.175,1.6 r0.125
  lines w0.2: -1.905,-0.365 -1.905,0.365 1.905,0.365 1.905,-0.365 -1.905,-0.365
Mechanical 8:
  lines w0.1: -1.27,-2.59 -1.27,-1.59 ; -1.27,-0.59 -1.27,-1.59 ; -1.27,0.59 -1.27,1.59 ; -1.27,2.59 -1.27,1.59 ; -1,0 0,0 ; -0.38,-0.765 0.38,-0.765 ; 0,-1 0,0 ; 0,0.59 0,1.59 0,2.59 ; 0,1 0,0 ; 1,0 0,0 ; 1.27,-2.59 1.27,-1.59 1.27,-0.59 ; 1.27,0.59 1.27,1.59 1.27,2.59 ; 1.65,-1.59 -1.27,-1.59 ; 1.65,1.59 -1.27,1.59 ; -1.65,-2.415 -1.65,-0.765 -0.89,-0.765 -0.89,-2.415 -1.65,-2.415 ; -1.65,0.765 -1.65,2.415 -0.89,2.415 -0.89,0.765 -1.65,0.765 ; -0.38,0.765 -0.38,2.415 0.38,2.415 0.38,0.765 -0.38,0.765 ; 0.89,-2.415 0.89,-0.765 1.65,-0.765 1.65,-2.415 0.89,-2.415 ; 0.89,0.765 0.89,2.415 1.65,2.415 1.65,0.765 0.89,0.765
Mechanical 14:
  circle w0.25: c-2.175,1.6 r0.125
  lines w0.1: -1.625,-1.905 -1.625,-1.145 -0.915,-1.145 -0.915,-1.905 ; -1.625,1.905 -1.625,1.145 -0.915,1.145 -0.915,1.905 ; -0.355,1.905 -0.355,1.145 0.355,1.145 0.355,1.905 ; 0.915,-1.905 0.915,-1.145 1.625,-1.145 1.625,-1.905 ; 0.915,1.905 0.915,1.145 1.625,1.145 1.625,1.905 ; -1.905,-1.905 -1.905,1.905 1.905,1.905 1.905,-1.905 -1.905,-1.905
Mechanical 15:
  lines w0.05: -2.155,-2.665 -2.155,2.665 2.155,2.665 2.155,-2.665 -2.155,-2.665
3D body "XFMR_MINI-CIRCUITS_AT224-3.stp": height 3.81, standoff 0, extent -1.905,-1.905 1.905,1.905

## XFMR_MINI-CIRCUITS_CD542 [mm] "MINI-CIRCUITS RF Transformer, Case CD542 - Body 7.87 X 5.58mm"
height 2.84
pads (6):
  rect 1.65x2.54 smd: 1(-2.54,-2.54) 2(0,-2.54) 3(2.54,-2.54) 4(2.54,2.54) 5(0,2.54) 6(-2.54,2.54)
Top Overlay:
  circle w0.25: c-3.8,-3.65 r0.125
  lines w0.2: -3.665,-2.79 -3.935,-2.79 -3.935,2.79 -3.665,2.79 ; 3.665,-2.79 3.935,-2.79 3.935,2.79 3.665,2.79
Mechanical 8:
  lines w0.1: -3.04,-2.54 -2.54,-2.54 ; -3.04,2.54 -2.54,2.54 ; -3.04,3.18 -2.54,3.18 ; -2.54,-3.04 -2.54,-2.54 ; -2.54,-2.04 -2.54,-2.54 ; -2.54,2.04 -2.54,2.54 ; -2.54,2.68 -2.54,3.18 ; -2.54,3.04 -2.54,2.54 ; -2.54,3.68 -2.54,3.18 ; -2.04,-2.54 -2.54,-2.54 ; -2.04,2.54 -2.54,2.54 ; -2.04,3.18 -2.54,3.18 ; -0.5,-2.54 0,-2.54 ; -0.5,0 0,0 ; -0.5,2.54 0,2.54 ; 0,-3.04 0,-2.54 ; 0,-2.04 0,-2.54 ; 0,-0.5 0,0 ; 0,0.5 0,0 ; 0,2.04 0,2.54 ; 0,3.04 0,2.54 ; 0.5,-2.54 0,-2.54 ; 0.5,0 0,0 ; 0.5,2.54 0,2.54 ; 2.04,-2.54 2.54,-2.54 ; 2.04,2.54 2.54,2.54 ; 2.54,-3.04 2.54,-2.54 ; 2.54,-2.04 2.54,-2.54 ; 2.54,2.04 2.54,2.54 ; 2.54,3.04 2.54,2.54 ; 3.04,-2.54 2.54,-2.54 ; 3.04,2.54 2.54,2.54 ; -3.365,-3.81 -1.715,-3.81 -1.715,-1.27 -3.365,-1.27 -3.365,-3.81 ; -3.365,1.27 -3.365,3.81 -1.715,3.81 -1.715,1.27 -3.365,1.27 ; -0.825,-3.81 -0.825,-1.27 0.825,-1.27 0.825,-3.81 -0.825,-3.81 ; -0.825,1.27 -0.825,3.81 0.825,3.81 0.825,1.27 -0.825,1.27 ; 1.715,-3.81 1.715,-1.27 3.365,-1.27 3.365,-3.81 1.715,-3.81 ; 1.715,1.27 1.715,3.81 3.365,3.81 3.365,1.27 1.715,1.27
Mechanical 14:
  circle w0.25: c-3.8,-3.65 r0.125
  lines w0.1: -2.92,-2.79 -2.92,-3.45 -2.16,-3.45 -2.16,-2.79 ; -2.92,2.79 -2.92,3.45 -2.16,3.45 -2.16,2.79 ; -0.38,-2.79 -0.38,-3.45 0.38,-3.45 0.38,-2.79 ; -0.38,2.79 -0.38,3.45 0.38,3.45 0.38,2.79 ; 2.16,-2.79 2.16,-3.45 2.92,-3.45 2.92,-2.79 ; 2.16,2.79 2.16,3.45 2.92,3.45 2.92,2.79 ; -3.935,-2.79 3.935,-2.79 3.935,2.79 -3.935,2.79 -3.935,-2.79
Mechanical 15:
  lines w0.05: -4.185,-4.06 4.185,-4.06 4.185,4.06 -4.185,4.06 -4.185,-4.06
3D body "XFMR_MINI-CIRCUITS_CD542.stp": height 2.84, standoff 0, extent -3.935,-3.45 3.935,3.45

## XFMR_MINI-CIRCUITS_DB714 [mm] "MINI-CIRCUITS RF Transformer, Case DB715 - Body 4.06X3.81mm"
height 4.06
pads (6):
  rect 0.76x1.65 smd: 1(-1.27,1.59) 2(0,1.59) 3(1.27,1.59) 4(1.27,-1.59) 5(0,-1.59) 6(-1.27,-1.59)
Top Overlay:
  circle w0.25: c-2.175,1.6 r0.125
  lines w0.2: -1.625,-0.365 1.625,-0.365 1.625,0.365 -1.625,0.365 -1.625,-0.365
Mechanical 8:
  lines w0.1: -1.27,-2.59 -1.27,-1.59 ; -1.27,-0.59 -1.27,-1.59 ; -1.27,0.59 -1.27,1.59 ; -1.27,2.59 -1.27,1.59 ; -1,0 0,0 ; 0,-2.59 0,-1.59 0,-0.59 ; 0,-1 0,0 ; 0,0.59 0,1.59 0,2.59 ; 0,1 0,0 ; 1,0 0,0 ; 1.27,-2.59 1.27,-1.59 1.27,-0.59 ; 1.27,0.59 1.27,1.59 1.27,2.59 ; 1.65,-1.59 -1.27,-1.59 ; 1.65,1.59 -1.27,1.59
Mechanical 14:
  circle w0.25: c-2.175,1.6 r0.125
  lines w0.1: -1.625,-2.03 1.625,-2.03 ; -1.625,-2.03 -1.625,2.03 ; -1.625,-2.03 -1.625,-1.01 -0.915,-1.01 -0.915,-2.03 -1.625,-2.03 ; -1.625,2.03 1.625,2.03 ; -1.625,2.03 -1.625,1.01 -0.915,1.01 -0.915,2.03 -1.625,2.03 ; 1.625,-2.03 1.625,2.03 ; 1.625,-2.03 0.915,-2.03 0.915,-1.01 1.625,-1.01 1.625,-2.03 ; 1.625,2.03 1.625,1.01 0.915,1.01 0.915,2.03 1.625,2.03 ; -0.355,-2.03 -0.355,-1.01 0.355,-1.01 0.355,-2.03 -0.355,-2.03 ; -0.355,1.01 -0.355,2.03 0.355,2.03 0.355,1.01 -0.355,1.01
3D body "XFMR_MINI-CIRCUITS_DB714.stp": height 3.76, standoff 0, extent -1.625,-2.03 1.625,2.03